# Altium footprint library XU-GENARAL PCB .PcbLib: 1176 footprints (part 22 of 75)
Each footprint in its own frame and in the unit in brackets; x right, y up, seen from the top. Pads: shape width x height; smd on the part's side, far side on the other; paste and mask are expansions set on the pad; w line width, h text height; cw(c..) or ccw(c..) is an arc to the next point about the centre after c.
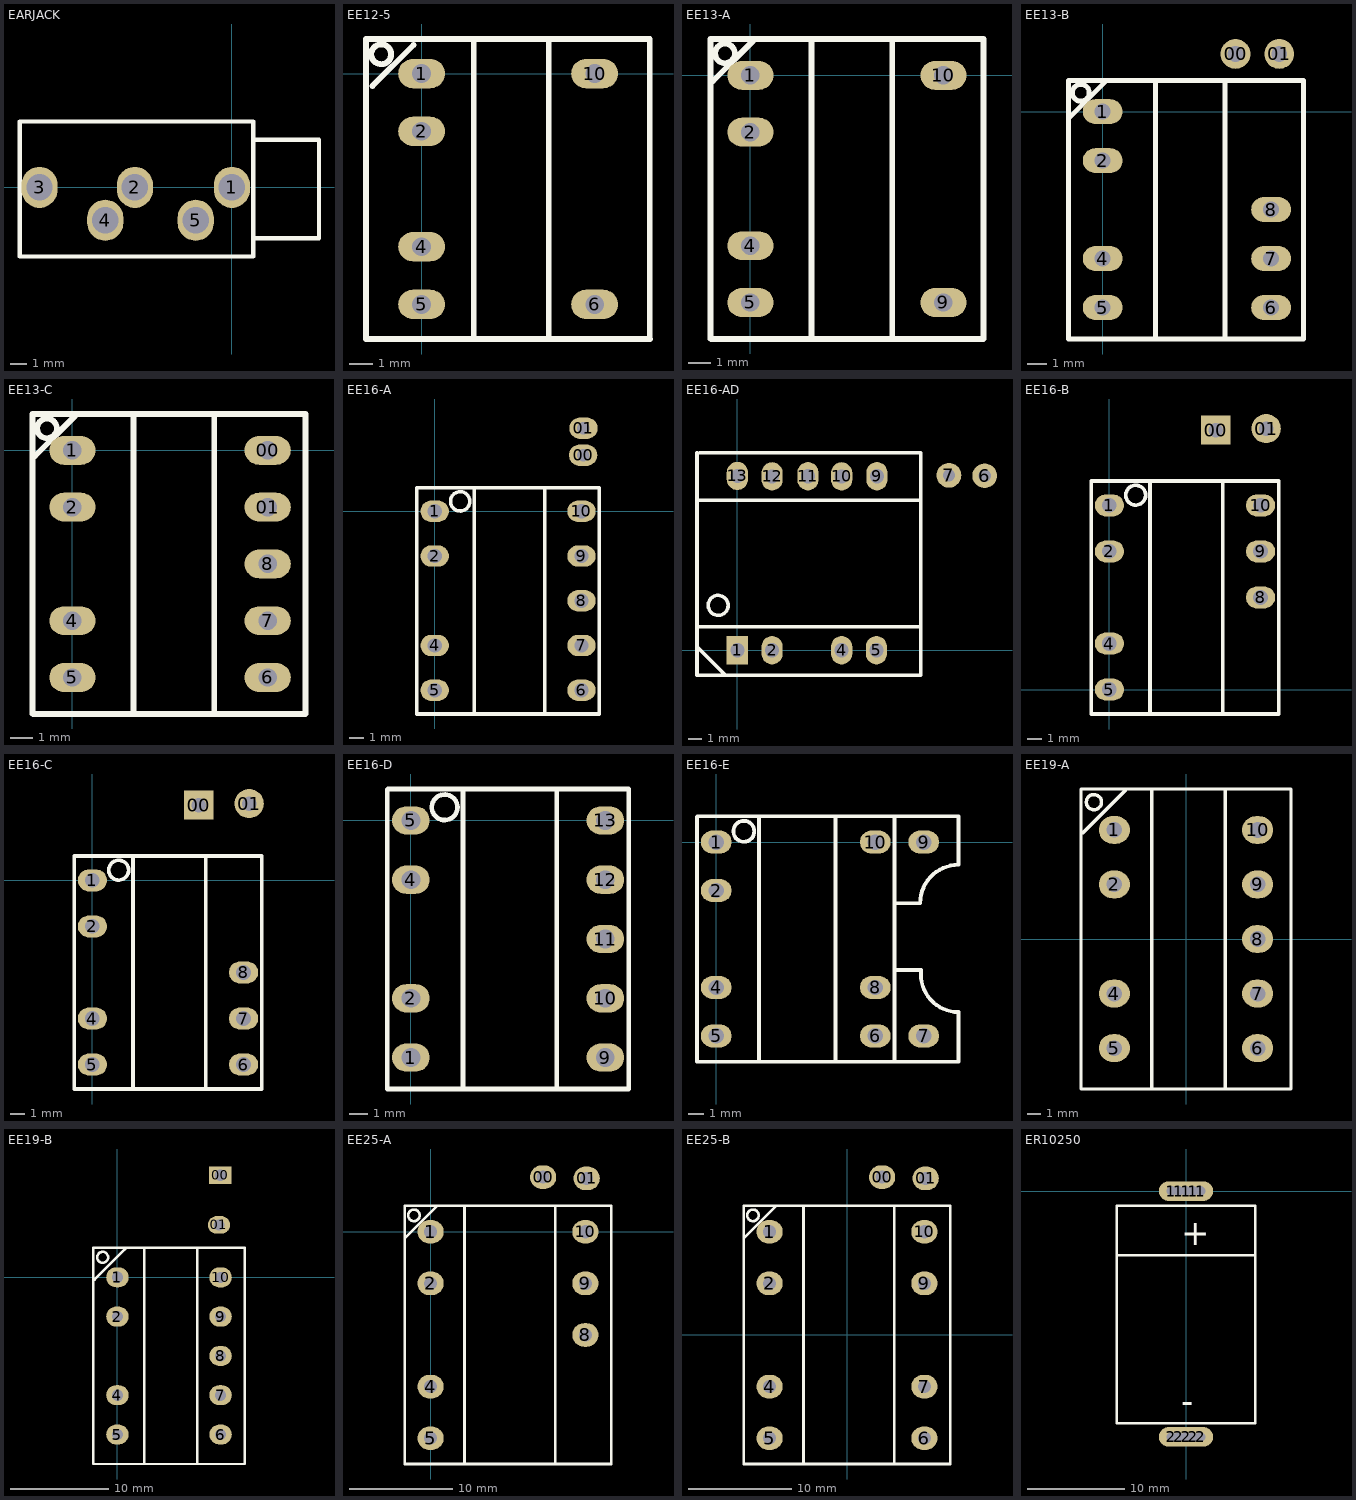
[diagram p21: the footprints below, top view; thin cyan lines are the x and y axes]

## EARJACK [mm]
pads (5):
  oval 2.2x2.5 hole 1.6: 1(0,0) 2(-5.9,0) 3(-11.7,0) 4(-7.7,-2) 5(-2.2,-2)
Top Overlay:
  lines w0.254: 1.3,-3.1 5.3,-3.1 5.3,2.9 1.3,2.9 ; -12.9,-4.2 -12.9,4 1.3,4 1.3,-4.2 -12.9,-4.2

## EE12-5 [mil]
pads (6):
  oval 80x50 hole 32: 1(0,0) 2(0,-98.42) 4(0,-295.28) 5(0,-393.7) 6(295.28,-393.7) 10(295.28,0)
Top Overlay:
  circle w10: c-69,33 r17
  lines w10: -84,-21 -14,49 ; 89,-452.76 89,59.06 ; 217,-452.76 217,59.06 ; 389.25,-452.76 389.25,59.06 -95,59.06 -95,-452.76 389.76,-452.76

## EE13-A [mil]
pads (6):
  oval 80x50 hole 32: 1(0,0) 2(0,-98.42) 4(0,-295.28) 5(0,-393.7) 9(334.65,-393.7) 10(334.65,0)
Top Overlay:
  circle w10: c-44,38 r17
  lines w10: -69,-456.69 -69,62 ; -68.9,62.99 403.54,62.99 ; -68,-457 403.54,-457 ; -67,-10 -65,-10 5,60 ; 106,-457 106,62.99 ; 246,-457 246,60 ; 404,-456.69 404,63

## EE13-B [mil]
pads (9):
  round 60 hole 32: 00(267,116) 01(355,116)
  oval 80x50 hole 32: 1(0,0) 2(0,-98.42) 4(0,-295.28) 5(0,-393.7) 6(338.58,-393.7) 7(338.58,-295.28) 8(338.58,-196.85)
Top Overlay:
  circle w10: c-44,38 r17
  lines w10: -69,-456.69 -69,62 ; -68.9,62.99 403.54,62.99 ; -68,-457 403.54,-457 ; -67,-10 -65,-10 5,60 ; 106,-457 106,62.99 ; 246,-457 246,60 ; 404,-456.69 404,63

## EE13-C [mil]
pads (9):
  oval 80x50 hole 32: 00(338.58,0) 1(0,0) 01(338.58,-98.43) 2(0,-98.42) 4(0,-295.28) 5(0,-393.7) 6(338.58,-393.7) 7(338.58,-295.28) 8(338.58,-196.85)
Top Overlay:
  circle w10: c-44,38 r17
  lines w10: -69,-456.69 -69,62 ; -68.9,62.99 403.54,62.99 ; -68,-457 403.54,-457 ; -67,-10 -65,-10 5,60 ; 106,-457 106,62.99 ; 246,-457 246,60 ; 404,-456.69 404,63

## EE16-A [mil]
pads (11):
  oval 80x60 hole 35: 00(418,158) 01(419,234)
  oval 80x60 hole 40: 1(0,0) 2(0,-125.98) 4(0,-377.95) 5(0,-503.94) 6(413.39,-503.94) 7(413.39,-377.95) 8(413.39,-251.97) 9(413.39,-125.98) 10(413.39,0)
Top Overlay:
  circle w10: c71.8,28 r27.2
  lines w10: -50,-570.87 -50,66 ; -49.21,-570.87 462.6,-570.87 ; -49.21,66.93 462.6,66.93 ; 111,-570.87 111,66.93 ; 310,-570.87 310,65 ; 463,-570.87 463,66

## EE16-AD [mil]
pads (13):
  rect 60x80 hole 40: 1(0,0)
  oval 60x80 hole 40: 2(98.42,0) 4(295.28,0) 5(393.7,0) 9(395,492.5) 10(295.28,492.13) 11(200,492.5) 12(98.42,492.13) 13(0,493.39)
  round 0 all layers, no hole: 3(251.97,0) 8(251.97,493.39)
  round 70 hole 35: 6(700,494) 7(599,495)
Top Overlay:
  circle w10: c-54.28,127 r28.28
  lines w10: -114.17,10 -33.31,-70.87 ; -114.17,425.2 519.68,425.2 ; -114.17,559.05 -114.17,500 -114.17,-70.87 519.68,-70.87 519.68,500 519.68,559.05 -106.3,559.05 ; -110.24,66.93 519.68,66.93

## EE16-B [mil]
pads (9):
  rect 80x80 hole 40: 00(291,710)
  oval 80x60 hole 40: 1(0,503.94) 2(0,377.95) 4(0,125.98) 5(0,0) 8(413.39,251.97) 9(413.39,377.95) 10(413.39,503.94)
  round 80 hole 40: 01(429,714)
Top Overlay:
  circle w10: c71.8,531.94 r27.2
  lines w10: -50,-66.93 -50,569.94 ; -49.21,-66.93 462.6,-66.93 ; -49.21,570.87 462.6,570.87 ; 111,-66.93 111,570.87 ; 310,-66.93 310,568.94 ; 463,-66.93 463,569.94

## EE16-C [mil]
pads (9):
  rect 80x80 hole 40: 00(291,206.06)
  oval 80x60 hole 40: 1(0,0) 2(0,-125.98) 4(0,-377.95) 5(0,-503.94) 6(413.39,-503.94) 7(413.39,-377.95) 8(413.39,-251.97)
  round 80 hole 40: 01(429,210.06)
Top Overlay:
  circle w10: c71.8,28 r27.2
  lines w10: -50,-570.87 -50,66 ; -49.21,-570.87 462.6,-570.87 ; -49.21,66.93 462.6,66.93 ; 111,-570.87 111,66.93 ; 310,-570.87 310,65 ; 463,-570.87 463,66

## EE16-D [mil]
pads (9):
  oval 80x60 hole 40: 1(0,-503.94) 2(0,-377.95) 4(0,-125.98) 5(0,0) 9(413.39,-503.94) 10(413.39,-377.95) 11(413.39,-251.97) 12(413.39,-125.98) 13(413.39,0)
Top Overlay:
  circle w10: c71.8,28 r27.2
  lines w10: -50,-570.87 -50,66 ; -49.21,-570.87 462.6,-570.87 ; -49.21,66.93 462.6,66.93 ; 111,-570.87 111,66.93 ; 310,-570.87 310,65 ; 463,-570.87 463,66

## EE16-E [mil]
pads (9):
  oval 80x60 hole 40: 1(0,0) 2(0,-125.98) 4(0,-377.95) 5(0,-503.94) 6(413.39,-503.94) 7(539.37,-503.94) 8(413.39,-377.95) 9(539.37,0) 10(413.39,0)
Top Overlay:
  circle w10: c71.8,28 r27.2
  lines w10: -50,-570.87 -50,66 ; -49.21,-570.87 629.92,-570.87 629.92,-441.92 cw(c629.92,-344) 532,-344 532,-333 463,-333 ; -49.21,66.93 629.92,66.93 629.92,-33.08 629.92,-59.08 ccw(c629.92,-159) 530,-159 463,-159 ; 111,-570.87 111,66.93 ; 310,-570.87 310,65 ; 463,-570.87 463,66

## EE19-A [mil]
pads (9):
  oval 90x80 hole 45: 1(-206.69,314.96) 2(-206.69,157.48) 4(-206.69,-157.48) 5(-206.69,-314.96) 6(206.69,-314.96) 7(206.69,-157.48) 8(206.69,0) 9(206.69,157.48) 10(206.72,314.7)
Top Overlay:
  circle w10: c-265.93,395 r21.93
  lines w10: -298,306 -176,428 ; -99,-433.07 -99,430 ; 113,-432.07 113,432 ; -303.15,-433.07 303.15,-433.07 303.15,433.07 -303.15,433.07 -303.15,-433.07

## EE19-B [mil]
pads (11):
  rect 90x70 hole 45: 00(412,409)
  oval 90x80 hole 45: 1(0,0) 2(0,-157.48) 4(0,-472.44) 5(0,-629.92) 6(413.39,-629.92) 7(413.39,-472.44) 8(413.39,-314.96) 9(413.39,-157.48) 10(413.42,-0.26)
  oval 90x70 hole 45: 01(407,210)
Top Overlay:
  circle w10: c-59.24,80.04 r21.93
  lines w10: -91.31,-8.96 30.69,113.04 ; 107.69,-748.03 107.69,115.04 ; 319.69,-747.03 319.69,117.04 ; -96.46,-748.03 509.84,-748.03 509.84,118.11 -96.46,118.11 -96.46,-748.03

## EE25-A [mil]
pads (9):
  oval 100x90 hole 50: 00(429.28,208.3) 1(0,0) 01(595.28,203.3) 2(0,-196.85) 4(0,-590.55) 5(0,-787.4) 8(590.55,-393.7) 9(590.55,-196.85) 10(590.55,0)
Top Overlay:
  circle w10: c-63.36,62.42 r21.93
  lines w10: -98.42,-23.57 23.58,98.42 ; 129.28,-885.83 129.28,98.42 ; 475.28,-884.83 475.28,98.42 ; -98.42,-885.83 688.98,-885.83 688.98,98.42 -98.42,98.42 -98.42,-885.83

## EE25-B [mm]
pads (10):
  oval 2.54x2.286 hole 1.27: 00(3.404,15.291) 1(-7.5,10) 01(7.62,15.164) 2(-7.5,5) 4(-7.5,-5) 5(-7.5,-10) 6(7.5,-10) 7(7.5,-5) 9(7.5,5) 10(7.5,10)
Top Overlay:
  circle w0.254: c-9.109,11.586 r0.557
  lines w0.254: -10,9.401 -6.901,12.5 ; -4.216,-12.5 -4.216,12.5 ; 4.572,-12.475 4.572,12.5 ; -10,-12.5 10,-12.5 10,12.5 -10,12.5 -10,-12.5

## ER10250 [mil]
pads (10):
  round 80 hole 40: 1(-59.05,0) 1(-29.53,0) 1(29.53,0) 1(59.05,0) 2(-59.05,-996.06) 2(-29.53,-996.06) 2(29.53,-996.06) 2(59.05,-996.06)
  oval 220x80 hole 40: 1(0,0) 2(0,-996.06)
Top Overlay:
  lines w10: -280,-260 280,-260 ; -280,-60 -280,-940 -0.47,-940 ; -279.53,-60 0,-60 279.53,-60 ; 0,-940 279.53,-940 ; 280,-940 280,-60
  text "+" at -20,-220 h100
  text "-" at -20,-900 h100